# Altium footprint library PcbLib.PcbLib: 45 footprints (part 2 of 3)
Each footprint in its own frame and in the unit in brackets; x right, y up, seen from the top. Pads: shape width x height; smd on the part's side, far side on the other; paste and mask are expansions set on the pad; w line width, h text height; cw(c..) or ccw(c..) is an arc to the next point about the centre after c.
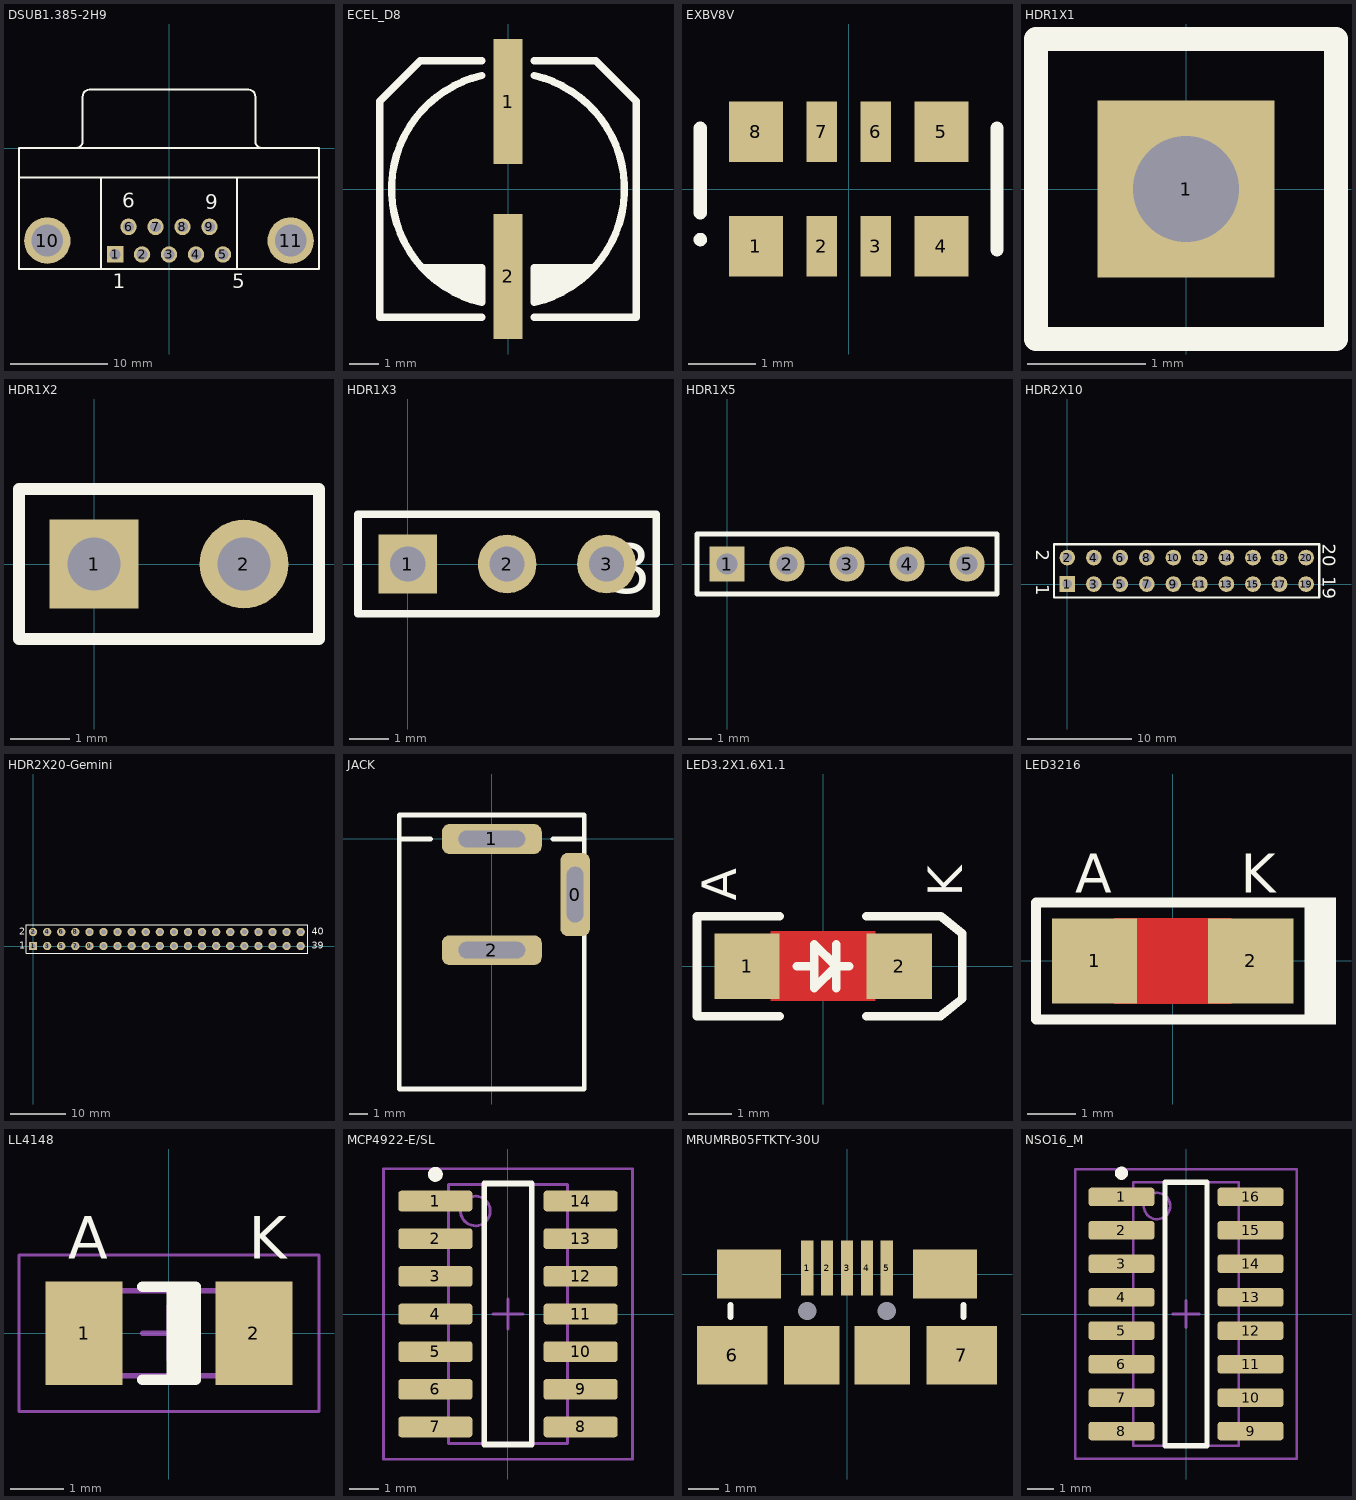
[diagram p1: the footprints below, top view; thin cyan lines are the x and y axes]

## DSUB1.385-2H9 [mm] "Connector; D Subminiature; 9 Position; Right Angle; Pitch 1.385 mm"
height 12.75
pads (11):
  rect 1.69x1.69 hole 1.09: 1(-5.54,-10.92)
  round 1.69 hole 1.09: 2(-2.77,-10.92) 3(0,-10.92) 4(2.77,-10.92) 5(5.54,-10.92) 6(-4.155,-8.08) 7(-1.385,-8.08) 8(1.385,-8.08) 9(4.155,-8.08)
  round 4.76 hole 3.26: 10(-12.495,-9.5) 11(12.495,-9.5)
Top Overlay:
  lines w0.2: -15.4,-3 15.4,-3 ; -9.56,0.005 ccw(c-9.56,0.7) -8.865,0.7 -8.865,5.3 ; -8.86,5.305 cw(c-8.165,5.305) -8.165,6 8.165,6 cw(c8.165,5.305) 8.86,5.305 ; -7,-12.4 -7,-3 ; 7,-12.4 7,-3 ; 8.865,5.3 8.865,0.7 ccw(c9.56,0.7) 9.56,0.005 ; -15.4,-12.4 -15.4,0 15.4,0 15.4,-12.4 -15.4,-12.4
  text "1" at -5.79,-14.375 h1.5
  text "5" at 6.5,-14.4 h1.5
  text "9" at 3.7,-6.3 h1.5
  text "6" at -4.8,-6.1 h1.5

## ECEL_D8 [mm] "CAP ELECT 8MM DIAMETER"
height 5.5
pads (2):
  rect 1x4.3 smd paste+0 mask+0.1: 1(0,3) 2(0,-3)
Top Overlay:
  lines w0.254: -3.017,4.4 -0.9,4.4 ; -3.017,4.4 -4.4,3.017 -4.4,-4.4 -0.9,-4.4 ; -2.946,-2.703 -0.906,-2.703 -0.9,-2.709 -0.9,-3.897 cw(c0,0) -0.9,3.897 ; -2.71,-2.931 -0.9,-2.931 ; -2.456,-3.16 -0.9,-3.16 ; -2.1,-3.388 -0.9,-3.388 ; -1.676,-3.617 -0.9,-3.617 ; 0.9,-4.4 4.4,-4.4 4.4,3.017 3.017,4.4 ; 0.9,-3.617 1.676,-3.617 ; 0.9,-3.388 2.1,-3.388 ; 0.9,-3.16 2.456,-3.16 ; 0.9,-2.931 2.71,-2.931 ; 0.9,3.897 cw(c0,0) 0.9,-3.897 0.9,-2.709 0.906,-2.703 2.946,-2.703 ; 0.9,4.4 3.017,4.4

## EXBV8V [mm]
pads (8):
  rect 0.8x0.9 smd paste+0 mask+0.1: 1(-1.375,-0.85) 4(1.375,-0.85) 5(1.375,0.85) 8(-1.375,0.85)
  rect 0.45x0.9 smd paste+0 mask+0.1: 2(-0.4,-0.85) 3(0.4,-0.85) 6(0.4,0.85) 7(-0.4,0.85)
Top Overlay:
  circle w0.1: c-2.2,-0.75 r0.05
  lines w0.2: -2.2,-0.35 -2.2,0.9 ; 2.2,-0.9 2.2,0.9

## HDR1X1 [mm]
height 0.6
pads (1):
  rect 1.5x1.5 hole 0.9 paste+0 mask+0.1: 1(0,0)
Top Overlay:
  lines w0.2: -1.27,-1.27 -1.27,1.27 1.27,1.27 1.27,-1.27 -1.27,-1.27

## HDR1X2 [mm] "Connector; Header; 2 Position"
height 1.5
pads (2):
  rect 1.5x1.5 hole 0.9: 1(0,0)
  round 1.5 hole 0.9: 2(2.54,0)
Top Overlay:
  lines w0.2: -1.27,-1.27 3.81,-1.27 3.81,1.27 -1.27,1.27 -1.27,-1.27
3D body: height 8.18, standoff -2.62, extent -1.29,-1.15 3.79,1.263

## HDR1X3 [mm] "Connector; Header; 3 Position"
height 0.6
pads (3):
  rect 1.5x1.5 hole 0.9 paste+0 mask+0.1: 1(0,0)
  round 1.5 hole 0.9 paste+0 mask+0.1: 2(2.54,0) 3(5.08,0)
Top Overlay:
  lines w0.2: -1.27,-1.27 -1.27,1.27 6.35,1.27 6.35,-1.27 -1.27,-1.27
  text "3" at 5.125,-0.75 h1.27
  text "1" at -0.9,-0.7 h1.27
3D body: height 8.18, standoff -2.62, extent -1.27,-1.206 6.35,1.207

## HDR1X5 [mm] "Connector; Header; 5 Position"
pads (5):
  rect 1.5x1.5 hole 0.9: 1(0,0)
  round 1.5 hole 0.9: 2(2.54,0) 3(5.08,0) 4(7.62,0) 5(10.16,0)
Top Overlay:
  lines w0.2: -1.27,-1.27 11.43,-1.27 11.43,1.27 -1.27,1.27 -1.27,-1.27
  text "5" at 9.575,-0.65 h1.27
  text "1" at -0.55,-0.675 h1.27

## HDR2X10 [mm] "Connector; Header; 10x2 Position"
height 0.6
pads (20):
  rect 1.5x1.5 hole 0.9: 1(0,0)
  round 1.5 hole 0.9: 2(0,2.54) 3(2.54,0) 4(2.54,2.54) 5(5.08,0) 6(5.08,2.54) 7(7.62,0) 8(7.62,2.54) 9(10.16,0) 10(10.16,2.54) 11(12.7,0) 12(12.7,2.54) 13(15.24,0) 14(15.24,2.54) 15(17.78,0) 16(17.78,2.54) 17(20.32,0) 18(20.32,2.54) 19(22.86,0) 20(22.86,2.54)
Top Overlay:
  lines w0.2: -1.27,-1.27 -1.27,3.81 0.635,3.81 24.13,3.81 24.13,-1.27 0.635,-1.27 -1.27,-1.27
  text "2" at -3,3.3 h1.27
  text "1" at -3,0 h1.27
  text "19" at 24.46,0.74 h1.27
  text "20" at 24.46,3.84 h1.27

## HDR2X20-Gemini [mm] "Connector; Header; 20x2 Position"
height 3.5
pads (40):
  rect 1.5x1.5 hole 0.9: 1(0,0)
  round 1.5 hole 0.9: 2(0,2.54) 3(2.54,0) 4(2.54,2.54) 5(5.08,0) 6(5.08,2.54) 7(7.62,0) 8(7.62,2.54) 9(10.16,0) 10(10.16,2.54) 11(12.7,0) 12(12.7,2.54) 13(15.24,0) 14(15.24,2.54) 15(17.78,0) 16(17.78,2.54) 17(20.32,0) 18(20.32,2.54) 19(22.86,0) 20(22.86,2.54) 21(25.4,0) 22(25.4,2.54) 23(27.94,0) 24(27.94,2.54) 25(30.48,0) 26(30.48,2.54) 27(33.02,0) 28(33.02,2.54) 29(35.56,0) 30(35.56,2.54) 31(38.1,0) 32(38.1,2.54) 33(40.64,0) 34(40.64,2.54) 35(43.18,0) 36(43.18,2.54) 37(45.72,0) 38(45.72,2.54) 39(48.26,0) 40(48.26,2.54)
Top Overlay:
  lines w0.2: -1.27,-1.27 -1.27,3.81 49.53,3.81 49.53,-1.27 -1.27,-1.27
  text "39" at 50.292,-0.508 h1.27
  text "40" at 50.292,2.032 h1.27
  text "2" at -2.54,2.032 h1.27
  text "1" at -2.54,-0.508 h1.27
3D body: height 7.54, standoff -3.25, extent -1.225,-1.088 24.175,3.738
3D body: height 7.54, standoff -3.25, extent 24.145,-1.088 49.545,3.738

## JACK [mm]
pads (3):
  rrect50% 1.6x4.5 hole 0.9 slot 3 at 90 deg paste+0 mask+0.1: 0(4.5,-3)
  rrect50% 5.4x1.6 hole 0.9 slot 3.6 at 0 deg paste+0 mask+0.1: 1(0,0) 2(0,-6)
Top Overlay:
  lines w0.254: -5,0 -3.3,0 ; 3.3,0 5,0 ; -5,-13.5 -5,1.3 5,1.3 5,-13.5 -5,-13.5

## LED3.2X1.6X1.1 [mm] "SMT LED; 2 Flat Leads"
height 1.2
pads (2):
  rect 1.5x1.5 smd paste+0 mask+0.1: 1(-1.75,0) 2(1.75,0)
Top Layer:
  pour cut-out: -1.2,0.8 -1.2,-0.8 1.2,-0.8 1.2,0.8
Top Overlay:
  lines w0.2: -1,-1.15 -2.9,-1.15 -2.9,1.15 -1,1.15 ; -0.6,0 -0.2,0 ; 0.3,-0.5 0.3,0.5 ; 0.6,0 0.3,0 ; 1,-1.15 2.7,-1.15 3.2,-0.75 3.2,0.75 2.7,1.15 1,1.15 ; 0.3,0 -0.2,0.5 -0.2,-0.5 0.3,0
  text "A" at -2,1.5 h0.8
  text "K" at 3.2,1.6 h0.8
Mechanical 1:
  lines w0.1: -0.2,0 0.2,0 ; 0,-0.2 0,0.2

## LED3216 [mm] "Molded Diode, 2-Leads, Body 3.20x1.60mm, IPC Low Density"
height 1
pads (2):
  rect 1.75x1.75 smd: 1(-1.6,0) 2(1.6,0)
Top Layer:
  pour cut-out: -1.2,0.875 -1.2,-0.875 1.2,-0.875 1.2,0.875
Top Overlay:
  rectangle: 2.8,-1.3 3.35,1.3
  lines w0.2: -2.8,-1.2 2.8,-1.2 2.8,1.2 -2.8,1.2 -2.8,-1.2
  text "A" at -2,1.4 h0.8
  text "K" at 1.4,1.4 h0.8
Mechanical 13:
  rectangle: -1.6,-0.8 -1.17,0.8
  lines w0.1: -1.6,-0.8 1.6,-0.8 1.6,0.8 -1.6,0.8 -1.6,-0.8
Mechanical 15:
  lines w0.05: -2.8,-1.2 2.8,-1.2 2.8,1.2 -2.8,1.2 -2.8,-1.2
  lines w0.1: -0.5,0 0.5,0 ; 0,-0.5 0,0.5
3D body: height 1, standoff 0, extent -1.6,-0.8 1.6,0.8

## LL4148 [mm] "MELF Diode, 2-Leads, Body 3.30x1.60mm, IPC Low Density"
height 1.6
pads (2):
  rect 1.45x1.95 smd: 1(-1.6,0) 2(1.6,0)
Top Overlay:
  rectangle: -0.05,-0.875 0.5,0.875
  lines w0.2: -0.5,-0.875 0.5,-0.875 0.5,0.875 -0.5,0.875
  text "A" at -1.9,1.4 h0.8
  text "K" at 1.5,1.4 h0.8
Mechanical 13:
  lines w0.1: -1.65,-0.8 -1.65,0.8 1.65,0.8 1.65,-0.8 -1.65,-0.8
Mechanical 15:
  lines w0.05: -2.825,-1.475 -2.825,1.475 2.825,1.475 2.825,-1.475 -2.825,-1.475
  lines w0.1: -0.5,0 0.5,0 ; 0,-0.5 0,0.5
3D body: height 1.59, standoff 0, extent -1.65,-0.8 -1.15,0.797
3D body: height 1.58, standoff 0.04, extent -0.05,-0.771 0.55,0.768
3D body: height 1.58, standoff 0.04, extent -1.15,-0.77 1.15,0.767
3D body: height 1.59, standoff 0, extent 1.15,-0.8 1.65,0.797

## MCP4922-E/SL [mm]
height 0.6
pads (14):
  rrect30% 2.5x0.7 smd: 1(-2.45,3.81) 2(-2.45,2.54) 3(-2.45,1.27) 4(-2.45,0) 5(-2.45,-1.27) 6(-2.45,-2.54) 7(-2.45,-3.81) 8(2.45,-3.81) 9(2.45,-2.54) 10(2.45,-1.27) 11(2.45,0) 12(2.45,1.27) 13(2.45,2.54) 14(2.45,3.81)
Top Overlay:
  circle w0.25: c-2.45,4.71 r0.125
  lines w0.2: -0.8,-4.4 0.8,-4.4 0.8,4.4 -0.8,4.4 -0.8,-4.4
Mechanical 13:
  circle w0.1: c-1.1,3.475 r0.5
  lines w0.1: -2,-4.375 2,-4.375 2,4.375 -2,4.375 -2,-4.375
Mechanical 15:
  lines w0.1: -0.5,0 0.5,0 ; 0,-0.5 0,0.5 ; -4.2,-4.9 4.2,-4.9 4.2,4.9 -4.2,4.9 -4.2,-4.9
3D body: height 1.75, standoff 0, extent -2,-4.375 2,4.375

## MRUMRB05FTKTY-30U [mm]
height 0.6
pads (13):
  rect 0.4x1.8 smd paste+0 mask+0.1: 1(-1.3,0.2) 2(-0.65,0.2) 3(0,0.2) 4(0.65,0.2) 5(1.3,0.2)
  rect 2.3x1.9 smd paste+0 mask+0.1: 6(-3.75,-2.65) 7(3.75,-2.65)
  rect 2.1x1.6 smd paste+0 mask+0.1: ""(-3.2,0) ""(3.2,0)
  round 0 hole 0.6: ""(-1.3,-1.2) ""(1.3,-1.2)
  rect 1.8x1.9 smd paste+0 mask+0.1: ""(-1.15,-2.65) ""(1.15,-2.65)
Top Overlay:
  lines w0.2: -3.8,-1.4 -3.8,-1 ; 3.8,-1.4 3.8,-1
Top Solder:
  rectangle: -1.6,-0.8 1.6,1.2
3D body: height 2.79, standoff -1.22, extent -3.956,-5.36 3.956,0.3

## NSO16_M [mm] "SOIC, 16-Leads, Body 9.9x3.9mm, Pitch 1.27mm, IPC Low Density"
height 1.75
pads (16):
  rrect30% 2.5x0.7 smd: 1(-2.45,4.445) 2(-2.45,3.175) 3(-2.45,1.905) 4(-2.45,0.635) 5(-2.45,-0.635) 6(-2.45,-1.905) 7(-2.45,-3.175) 8(-2.45,-4.445) 9(2.45,-4.445) 10(2.45,-3.175) 11(2.45,-1.905) 12(2.45,-0.635) 13(2.45,0.635) 14(2.45,1.905) 15(2.45,3.175) 16(2.45,4.445)
Top Overlay:
  circle w0.25: c-2.45,5.345 r0.125
  lines w0.2: -0.8,-5 0.8,-5 0.8,5 -0.8,5 -0.8,-5
Mechanical 13:
  circle w0.1: c-1.1,4.1 r0.5
  lines w0.1: -2,-5 2,-5 2,5 -2,5 -2,-5
Mechanical 15:
  lines w0.1: -0.5,0 0.5,0 ; 0,-0.5 0,0.5 ; -4.2,-5.5 4.2,-5.5 4.2,5.5 -4.2,5.5 -4.2,-5.5
3D body: height 1.75, standoff 0, extent -2,-5 2,5